# Altium footprint library Watch Max.PcbLib: 61 footprints (part 4 of 4)
Each footprint in its own frame and in the unit in brackets; x right, y up, seen from the top. Pads: shape width x height; smd on the part's side, far side on the other; paste and mask are expansions set on the pad; w line width, h text height; cw(c..) or ccw(c..) is an arc to the next point about the centre after c.
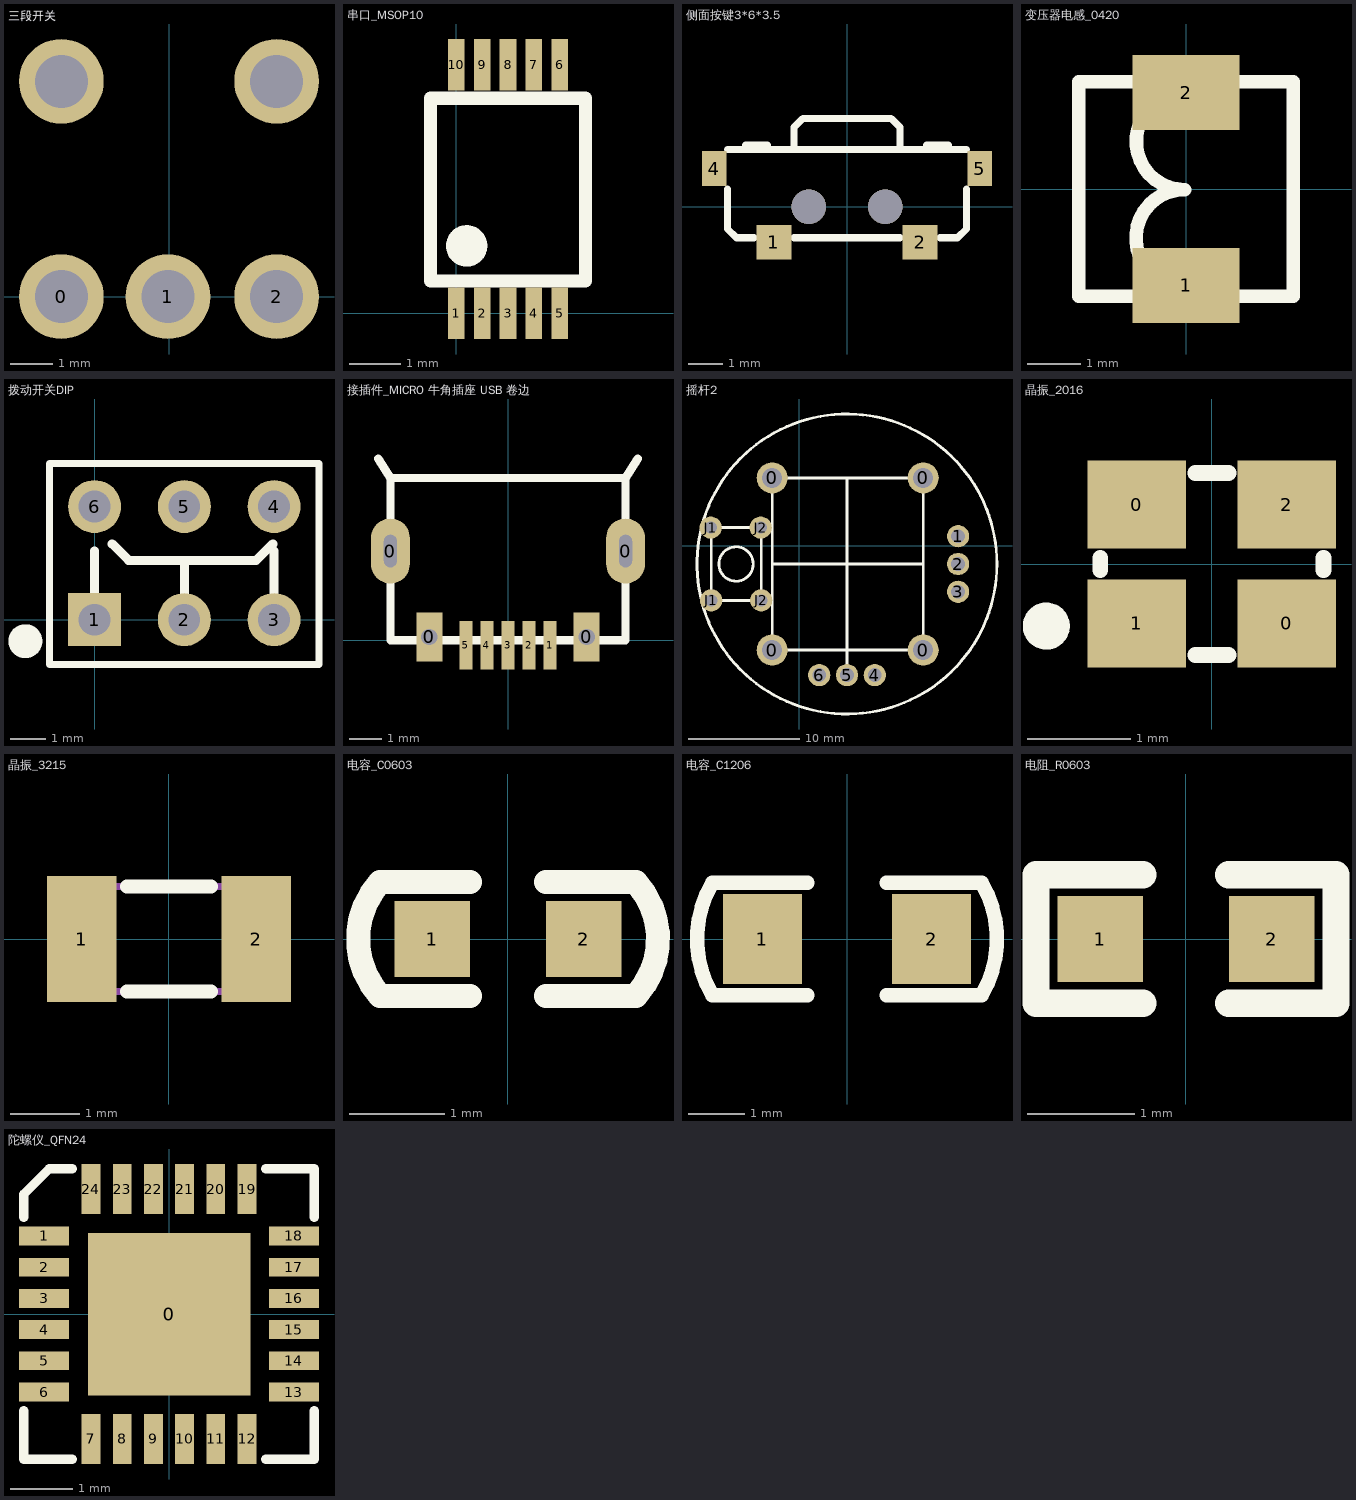
[diagram p3: the footprints below, top view; thin cyan lines are the x and y axes]

## 三段开关 [mm]
pads (5):
  round 2 hole 1.25: 0(-2.54,0) 1(-0.024,0) 2(2.54,0) ""(-2.54,5.08) ""(2.54,5.08)

## 串口_MSOP10 [mm]
pads (10):
  rect 0.32x1 smd: 1(0,0) 2(0.5,0) 3(1,0) 4(1.5,0) 5(2,0) 6(2,4.8) 7(1.5,4.8) 8(1,4.8) 9(0.5,4.8) 10(0,4.8)
Top Overlay:
  circle w0.4: c0.2,1.3 r0.2
  lines w0.254: -0.5,0.62 2.5,0.62 2.5,4.154 -0.5,4.154 -0.5,0.62

## 侧面按键3*6*3.5 [mm] "白色3*6*3.5"
height 3.5
pads (4):
  rect 1x1 smd: 1(-2.1,-1.016) 2(2.1,-1.016)
  rect 0.7x1 smd: 4(-3.81,1.1) 5(3.81,1.1)
via -1.1,0 diameter 1 hole 1
via 1.1,0 diameter 1 hole 1
Top Overlay:
  lines w0.203: -3.429,0.508 -3.429,-0.635 -3.175,-0.889 -2.667,-0.889 ; -3.429,1.651 3.429,1.651 ; -2.921,1.778 -2.286,1.778 ; -1.524,-0.889 1.524,-0.889 ; -1.524,1.651 -1.524,2.286 -1.27,2.54 1.27,2.54 1.524,2.286 1.524,1.651 ; 2.286,1.778 2.921,1.778 ; 2.667,-0.889 3.175,-0.889 3.429,-0.635 3.429,0.508
3D body "RS-032G05B3-SM_RT.stp": height 3.53, standoff 0.03, extent -4,-1.444 4,3.556

## 变压器电感_0420 [mm]
pads (2):
  rect 2x1.4 smd: 1(0,-1.8) 2(0,1.8)
Top Overlay:
  lines w0.254: -0.029,-1.812 cw(c-0.034,-0.912) -0.027,-0.012 ; -0.028,-0.012 cw(c-0.028,0.888) -0.028,1.788 ; -2,-2 -2,2 2,2 2,-2 -2,-2

## 拨动开关DIP [mm]
pads (6):
  rect 1.5x1.5 hole 0.9: 1(0,0)
  round 1.5 hole 0.9: 2(2.54,0) 3(5.08,0) 4(5.08,3.2) 5(2.54,3.2) 6(0,3.2)
Top Overlay:
  circle w0.6: c-1.958,-0.61 r0.18
  lines w0.2: 1.482,-1.27 6.35,-1.27 ; 6.35,-1.27 -1.27,-1.27 -1.27,4.42 6.35,4.42 6.35,-1.27
  lines w0.254: 0,0 0,1.948 ; 0.495,2.146 0.965,1.676 4.572,1.676 5.042,2.146 ; 2.54,0 2.54,1.676 ; 5.08,0 5.08,1.948
3D body "Selector Switch - MSS22D18.stp": height 5.55, standoff -0.27, extent -2.095,-1.93 7.074,4.978

## 接插件_MICRO 牛角插座 USB 卷边 [mm]
pads (9):
  oval 1.2x2 hole 0.4 slot 1 at 90 deg: 0(-3.625,2.75) 0(3.625,2.75)
  rect 0.8x1.5 hole 0.5: 0(-2.425,0.1) 0(2.425,0.1)
  rect 0.4x1.5 smd: 1(1.3,-0.15) 2(0.65,-0.15) 3(0,-0.15) 4(-0.65,-0.15) 5(-1.3,-0.15)
Top Overlay:
  lines w0.254: -4,5.6 -3.6,4.96 ; -3.625,4.96 -3.625,0 3.625,0 3.625,4.96 ; -3.625,5 3.625,5 ; 3.6,4.96 4,5.6
3D body "molex_0473460001.STEP": height 2.73, standoff -0.04, extent -3.99,-0.183 3.99,5.248

## 摇杆2 [mm]
pads (14):
  round 2.8 hole 1.8: 0(-2.413,-9.398) 0(-2.413,6.102) 0(11.176,-9.398) 0(11.176,6.102)
  round 2 hole 1.25: 1(14.318,0.849) 2(14.318,-1.651) 3(14.318,-4.151) 4(6.818,-11.651) 5(4.318,-11.651) 6(1.818,-11.651)
  round 2 hole 1.1: J1(-7.95,1.626) J1(-7.904,-4.925) J2(-3.45,1.626) J2(-3.404,-4.925)
Top Overlay:
  circle w0.254: c4.318,-1.651 r13.5
  circle w0.254: c-5.664,-1.651 r1.547
  lines w0.254: -7.95,1.626 -3.45,1.626 -3.404,1.579 -3.404,-4.925 -7.904,-4.925 -7.904,1.579 ; -2.413,-1.651 4.318,-1.651 ; 4.318,-11.651 4.318,-1.651 ; 4.318,6.102 4.318,-1.651 ; 11.087,-9.398 -2.413,-9.398 -2.413,6.102 11.087,6.102 ; 11.176,-9.398 11.176,6.102 ; 11.176,-1.651 4.318,-1.651
3D body "Thumb Joystick.STEP": height 30.58, standoff -3.94, extent -9.489,-15.074 18.161,12.026

## 晶振_2016 [mm]
pads (4):
  rect 0.95x0.85 smd: 0(-0.725,0.575) 0(0.725,-0.575) 1(-0.725,-0.575) 2(0.725,0.575)
Top Overlay:
  circle w0.254: c-1.6,-0.6 r0.1
  lines w0.152: -1.08,-0.06 -1.08,0.06 ; -0.16,-0.88 0.16,-0.88 ; -0.16,0.88 0.16,0.88 ; 1.08,-0.06 1.08,0.06
3D body: height 0.56, standoff 0.15, extent -0.7,-0.65 0.7,0.65
3D body "User Library-GeyerElectronics_KX5.step": height 0.56, standoff 0, extent -1.05,-0.85 1.05,0.85

## 晶振_3215 [mm] "XTAL SMD 3.2 x 1.5 mm"
height 0.8
pads (2):
  rect 1x1.8 smd: 1(-1.25,0) 2(1.25,0)
Top Overlay:
  lines w0.2: -0.6,-0.75 0.6,-0.75 ; -0.6,0.75 0.6,0.75
Mechanical 3:
  lines w0.1: -1.6,-0.55 cw(c-1.6,-0.75) -1.4,-0.75 1.4,-0.75 cw(c1.6,-0.75) 1.6,-0.55 1.6,0.55 cw(c1.6,0.75) 1.4,0.75 -1.4,0.75 cw(c-1.6,0.75) -1.6,0.55 -1.6,-0.55
3D body: height 0.81, standoff 0.15, extent -1.2,-0.6 1.2,0.6
3D body "User Library-Siward_SX3215.step": height 0.81, standoff 0, extent -1.6,-0.75 1.6,0.75

## 电容_C0603 [mm]
pads (2):
  rect 0.8x0.8 smd: 1(-0.8,0) 2(0.8,0)
Top Overlay:
  lines w0.254: -1.35,-0.6 -0.4,-0.6 ; -1.35,0.6 -0.4,0.6 ; -1.349,-0.599 cw(c-0.7,0) -1.349,0.599 ; 0.4,-0.6 1.35,-0.6 ; 0.4,0.6 1.35,0.6 ; 1.349,-0.599 ccw(c0.7,0) 1.362,0.585
3D body "User Library-0603 SMD Capacitor.STEP": height 0.3, standoff 0, extent -0.8,-0.4 0.8,0.4

## 电容_C1206 [mm]
pads (2):
  rect 1.4x1.6 smd: 1(-1.5,0) 2(1.5,0)
Top Overlay:
  lines w0.254: -2.387,-1 -0.7,-1 ; -2.387,-0.997 cw(c-0.7,0) -2.387,0.997 ; -2.387,1 -0.7,1 ; 0.7,-1 2.387,-1 ; 0.7,1 2.387,1 ; 2.387,-0.997 ccw(c0.7,0) 2.387,0.997
3D body "Capacitor 1206 SMD1.step": height 1, standoff 0, extent -1.6,-0.8 1.6,0.8

## 电阻_R0603 [mm]
pads (2):
  rect 0.8x0.8 smd: 1(-0.8,0) 2(0.8,0)
Top Overlay:
  lines w0.254: -0.4,-0.6 -1.4,-0.6 -1.4,0.6 -0.4,0.6 ; 0.4,-0.6 1.4,-0.6 1.4,0.6 0.4,0.6
3D body "R0603.STEP": height 0.45, standoff 0, extent -0.8,-0.4 0.8,0.4

## 陀螺仪_QFN24 [mm]
pads (25):
  rect 2.6x2.6 smd: 0(0.005,0)
  rect 0.8x0.3 smd: 1(-2,1.25) 2(-2,0.75) 3(-2,0.25) 4(-2,-0.25) 5(-2,-0.75) 6(-2,-1.25) 13(2,-1.25) 14(2,-0.75) 15(2,-0.25) 16(2,0.25) 17(2,0.75) 18(2,1.25)
  rect 0.3x0.8 smd: 7(-1.25,-2) 8(-0.75,-2) 9(-0.25,-2) 10(0.25,-2) 11(0.75,-2) 12(1.25,-2) 19(1.25,2) 20(0.75,2) 21(0.25,2) 22(-0.25,2) 23(-0.75,2) 24(-1.25,2)
Top Overlay:
  lines w0.15: -2.325,-1.55 -2.325,-2.325 -1.55,-2.325 ; -2.325,1.55 -2.325,1.917 -1.917,2.325 -1.55,2.325 ; 1.55,-2.325 2.325,-2.325 2.325,-1.55 ; 1.55,2.325 2.325,2.325 2.325,1.55
3D body "QFN24.step": height 0.9, standoff 0, extent -1.997,-2.002 2.007,2.002